# Altium footprint library 3.22-杂项.PcbLib: 985 footprints (part 13 of 64)
Each footprint in its own frame and in the unit in brackets; x right, y up, seen from the top. Pads: shape width x height; smd on the part's side, far side on the other; paste and mask are expansions set on the pad; w line width, h text height; cw(c..) or ccw(c..) is an arc to the next point about the centre after c.
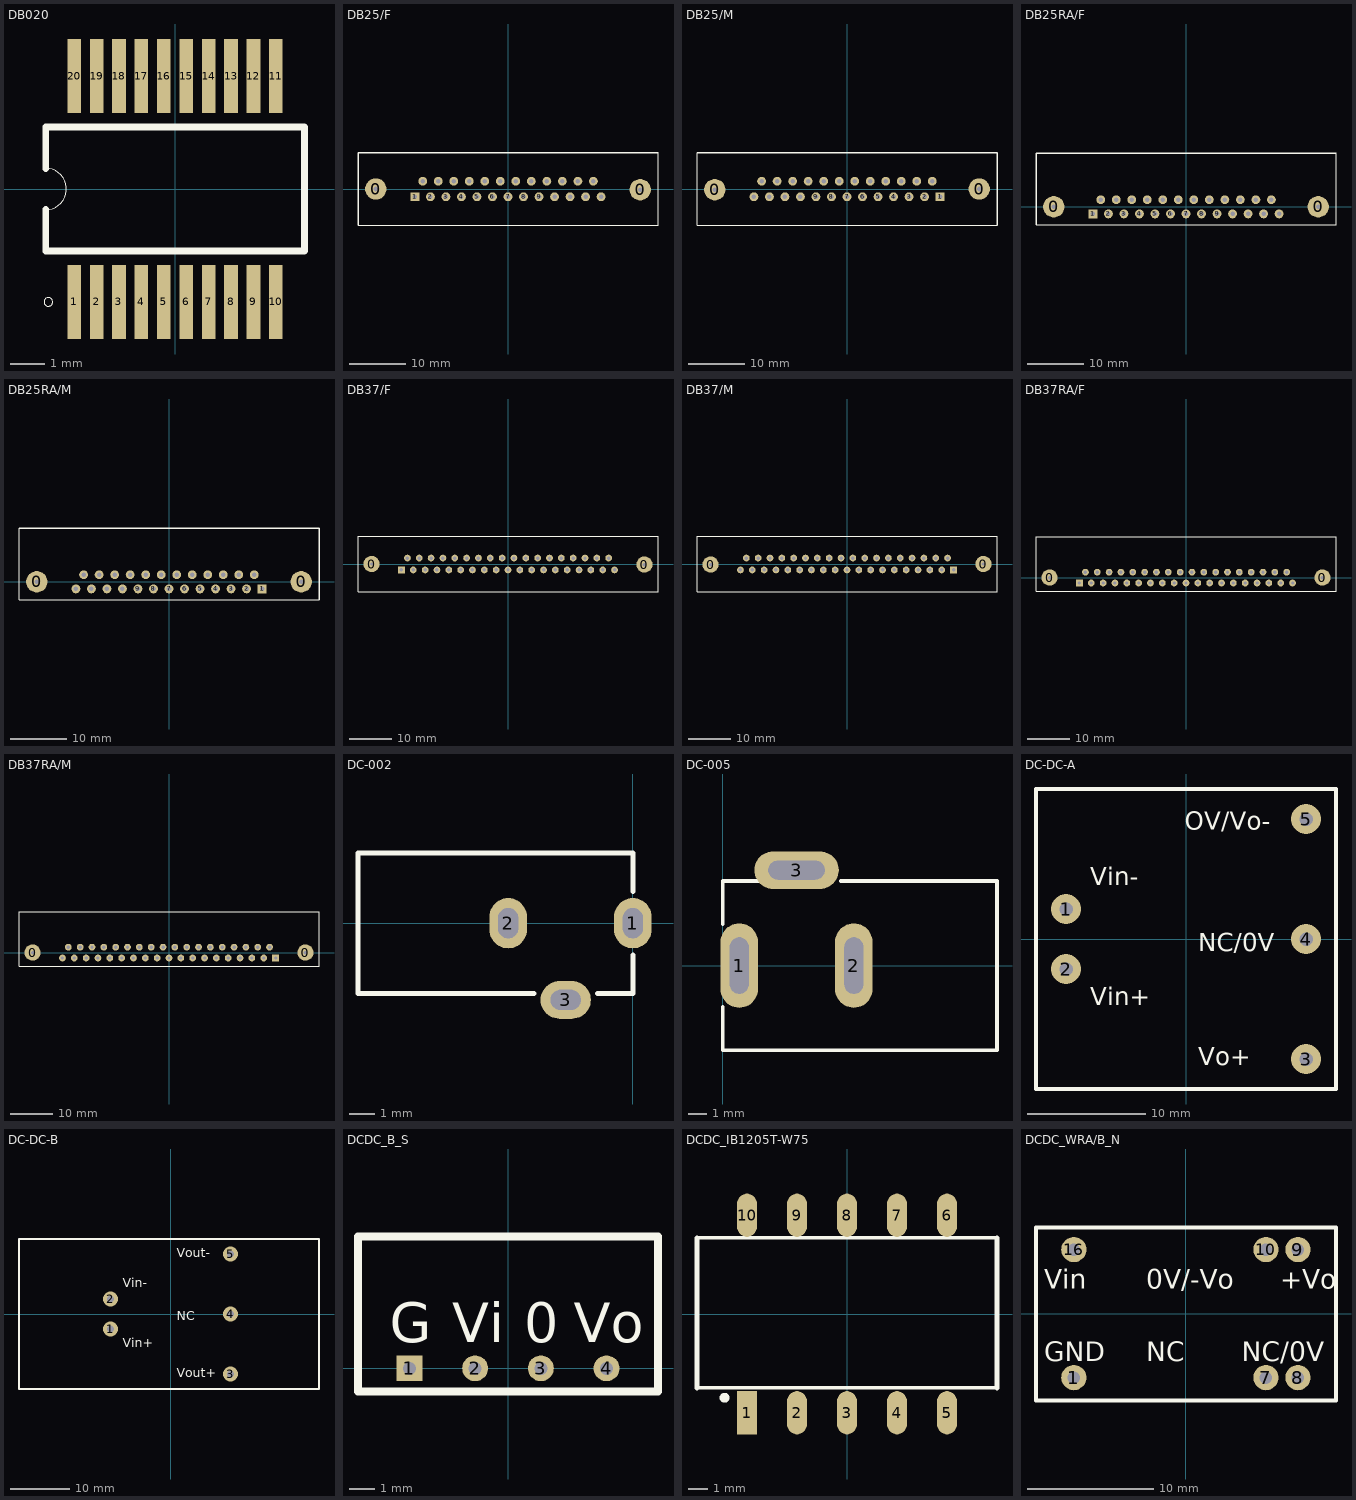
[diagram p12: the footprints below, top view; thin cyan lines are the x and y axes]

## DB020 [mm] "Plastic SSOP; 20 Leads; Body Width 5.3 mm; Pitch 0.65 mm"
height 2
pads (20):
  rect 0.396x2.15 smd: 1(-2.925,-3.275) 2(-2.275,-3.275) 3(-1.625,-3.275) 4(-0.975,-3.275) 5(-0.325,-3.275) 6(0.325,-3.275) 7(0.975,-3.275) 8(1.625,-3.275) 9(2.275,-3.275) 10(2.925,-3.275) 11(2.925,3.275) 12(2.275,3.275) 13(1.625,3.275) 14(0.975,3.275) 15(0.325,3.275) 16(-0.325,3.275) 17(-0.975,3.275) 18(-1.625,3.275) 19(-2.275,3.275) 20(-2.925,3.275)
Top Overlay:
  circle w0.025: c-3.675,-3.275 r0.125
  lines w0.025: -3.75,-0.6 ccw(c-3.75,0) -3.75,0.6
  lines w0.2: -3.75,-0.6 -3.75,-1.8 3.75,-1.8 3.75,1.8 -3.75,1.8 -3.75,0.6

## DB25/F [mil]
pads (27):
  round 150 hole 32: 0(-929,0) 0(929,-5)
  rect 62x62 hole 32: 1(-654,-55)
  round 62 hole 32: 2(-545,-55) 3(-436,-55) 4(-327,-55) 5(-218,-55) 6(-109,-55) 7(0,-55) 8(109,-55) 9(218,-55) 10(327,-55) 11(436,-55) 12(545,-55) 13(654,-55) 14(-599,55) 15(-490,55) 16(-381,55) 17(-272,55) 18(-163,55) 19(-54,55) 20(55,55) 21(164,55) 22(273,55) 23(382,55) 24(491,55) 25(600,55)
Top Overlay:
  lines w8: -1054,-255 1054,-255 1054,255
  lines w10: -1054,-255 -1054,255 1054,255

## DB25/M [mil]
pads (27):
  round 150 hole 32: 0(-929,-5) 0(929,0)
  rect 62x62 hole 32: 1(654,-55)
  round 62 hole 32: 2(545,-55) 3(436,-55) 4(327,-55) 5(218,-55) 6(109,-55) 7(0,-55) 8(-109,-55) 9(-218,-55) 10(-327,-55) 11(-436,-55) 12(-545,-55) 13(-654,-55) 14(599,55) 15(490,55) 16(381,55) 17(272,55) 18(163,55) 19(54,55) 20(-55,55) 21(-164,55) 22(-273,55) 23(-382,55) 24(-491,55) 25(-600,55)
Top Overlay:
  lines w8: -1054,255 -1054,-255 1054,-255
  lines w10: -1054,255 1054,255 1054,-255

## DB25RA/F [mil]
pads (27):
  round 150 hole 32: 0(-929,0) 0(929,0)
  rect 62x62 hole 32: 1(-654,-50)
  round 62 hole 32: 2(-545,-50) 3(-436,-50) 4(-327,-50) 5(-218,-50) 6(-109,-50) 7(0,-50) 8(109,-50) 9(218,-50) 10(327,-50) 11(436,-50) 12(545,-50) 13(654,-50) 14(-599,50) 15(-490,50) 16(-381,50) 17(-272,50) 18(-163,50) 19(-54,50) 20(55,50) 21(164,50) 22(273,50) 23(382,50) 24(491,50) 25(600,50)
Top Overlay:
  lines w8: -1054,-125 1054,-125 1054,375
  lines w10: -1054,-125 -1054,375 1054,375

## DB25RA/M [mil]
pads (27):
  round 150 hole 32: 0(-929,0) 0(929,0)
  rect 62x62 hole 32: 1(654,-50)
  round 62 hole 32: 2(545,-50) 3(436,-50) 4(327,-50) 5(218,-50) 6(109,-50) 7(0,-50) 8(-109,-50) 9(-218,-50) 10(-327,-50) 11(-436,-50) 12(-545,-50) 13(-654,-50) 14(599,50) 15(490,50) 16(381,50) 17(272,50) 18(163,50) 19(54,50) 20(-55,50) 21(-164,50) 22(-273,50) 23(-382,50) 24(-491,50) 25(-600,50)
Top Overlay:
  lines w8: -1054,375 -1054,-125 1054,-125
  lines w10: -1054,375 1054,375 1054,-125

## DB37/F [mil]
pads (39):
  round 150 hole 32: 0(-1256,0) 0(1256,-5)
  rect 62x62 hole 32: 1(-981,-55)
  round 62 hole 32: 2(-872,-55) 3(-763,-55) 4(-654,-55) 5(-545,-55) 6(-436,-55) 7(-327,-55) 8(-218,-55) 9(-109,-55) 10(0,-55) 11(109,-55) 12(218,-55) 13(327,-55) 14(436,-55) 15(545,-55) 16(654,-55) 17(763,-55) 18(872,-55) 19(981,-55) 20(-926,55) 21(-817,55) 22(-708,55) 23(-599,55) 24(-490,55) 25(-381,55) 26(-272,55) 27(-163,55) 28(-54,55) 29(55,55) 30(164,55) 31(273,55) 32(382,55) 33(491,55) 34(600,55) 35(709,55) 36(818,55) 37(927,55)
Top Overlay:
  lines w8: -1381,-255 1381,-255 1381,255
  lines w10: -1381,-255 -1381,255 1381,255

## DB37/M [mil]
pads (39):
  round 150 hole 32: 0(-1256,-5) 0(1256,0)
  rect 62x62 hole 32: 1(981,-55)
  round 62 hole 32: 2(872,-55) 3(763,-55) 4(654,-55) 5(545,-55) 6(436,-55) 7(327,-55) 8(218,-55) 9(109,-55) 10(0,-55) 11(-109,-55) 12(-218,-55) 13(-327,-55) 14(-436,-55) 15(-545,-55) 16(-654,-55) 17(-763,-55) 18(-872,-55) 19(-981,-55) 20(926,55) 21(817,55) 22(708,55) 23(599,55) 24(490,55) 25(381,55) 26(272,55) 27(163,55) 28(54,55) 29(-55,55) 30(-164,55) 31(-273,55) 32(-382,55) 33(-491,55) 34(-600,55) 35(-709,55) 36(-818,55) 37(-927,55)
Top Overlay:
  lines w8: -1381,255 -1381,-255 1381,-255
  lines w10: -1381,255 1381,255 1381,-255

## DB37RA/F [mil]
pads (39):
  round 150 hole 32: 0(-1256,0) 0(1256,0)
  rect 62x62 hole 32: 1(-981,-50)
  round 62 hole 32: 2(-872,-50) 3(-763,-50) 4(-654,-50) 5(-545,-50) 6(-436,-50) 7(-327,-50) 8(-218,-50) 9(-109,-50) 10(0,-50) 11(109,-50) 12(218,-50) 13(327,-50) 14(436,-50) 15(545,-50) 16(654,-50) 17(763,-50) 18(872,-50) 19(981,-50) 20(-926,50) 21(-817,50) 22(-708,50) 23(-599,50) 24(-490,50) 25(-381,50) 26(-272,50) 27(-163,50) 28(-54,50) 29(55,50) 30(164,50) 31(273,50) 32(382,50) 33(491,50) 34(600,50) 35(709,50) 36(818,50) 37(927,50)
Top Overlay:
  lines w8: -1381,-125 1381,-125 1381,375
  lines w10: -1381,-125 -1381,375 1381,375

## DB37RA/M [mil]
pads (39):
  round 150 hole 32: 0(-1256,0) 0(1256,0)
  rect 62x62 hole 32: 1(981,-50)
  round 62 hole 32: 2(872,-50) 3(763,-50) 4(654,-50) 5(545,-50) 6(436,-50) 7(327,-50) 8(218,-50) 9(109,-50) 10(0,-50) 11(-109,-50) 12(-218,-50) 13(-327,-50) 14(-436,-50) 15(-545,-50) 16(-654,-50) 17(-763,-50) 18(-872,-50) 19(-981,-50) 20(926,50) 21(817,50) 22(708,50) 23(599,50) 24(490,50) 25(381,50) 26(272,50) 27(163,50) 28(54,50) 29(-55,50) 30(-164,50) 31(-273,50) 32(-382,50) 33(-491,50) 34(-600,50) 35(-709,50) 36(-818,50) 37(-927,50)
Top Overlay:
  lines w8: -1381,375 -1381,-125 1381,-125
  lines w10: -1381,375 1381,375 1381,-125

## DC-002 [mm] "DC母座3.5mm"
height 7.2
pads (3):
  oval 1.5x2 hole 0.8 slot 1.2 at 90 deg: 1(0,0) 2(-4.953,0)
  oval 2x1.5 hole 0.8 slot 1.2 at 0 deg: 3(-2.667,-3.048)
Top Overlay:
  lines w0.2: -3.937,-2.794 -10.922,-2.794 -10.922,2.794 0,2.794 0,1.27 ; -1.397,-2.794 0,-2.794 0,-1.27
3D body: height 7.2, standoff 0, extent -10.922,-2.794 0,2.794

## DC-005 [mm] "DC母座5.5mm"
height 12.75
pads (3):
  oval 2x4.5 hole 1 slot 3 at 90 deg: 1(0.889,0) 2(6.985,0)
  oval 4.5x2 hole 1 slot 3 at 0 deg: 3(3.937,5.08)
Top Overlay:
  lines w0.2: 0.005,-2.2 0.005,-4.5 14.605,-4.5 14.605,4.5 6.305,4.5 ; 0.005,2.2 0.005,4.5 1.905,4.5
3D body: height 11, standoff 0, extent 0,-4.445 14.605,4.445

## DC-DC-A [mil] "电源模块Ａ型封装，长宽均为25.4"
height 393.7
pads (5):
  round 100 hole 45: 1(-400,100) 2(-400,-100) 3(400,-400) 4(400,0) 5(400,400)
Top Overlay:
  lines w12: -500,-500 500,-500 500,500 -500,500 -500,-500
  text "NC/0V" at 40,-40 h60
  text "Vin-" at -320,180 h60
  text "Vin+" at -320,-220 h60
  text "OV/Vo-" at -5,365 h60
  text "Vo+" at 40,-420 h60

## DC-DC-B [mil] "电源模块B型，25.4宽，50.8长"
height 393.7
pads (5):
  round 100 hole 45: 1(-400,-100) 2(-400,100) 3(400,-400) 4(400,0) 5(400,400)
Top Overlay:
  lines w12.01: -1010,-500 -1010,500 990,500 990,-500 -1010,-500
  text "Vout+" at 40,-420 h60
  text "Vout-" at 40,380 h60
  text "Vin+" at -320,-220 h60
  text "Vin-" at -320,180 h60
  text "NC" at 40,-40 h60

## DCDC_B_S [mm] "MORNSON B1205S-1W定电压1000VDC隔离非稳压单输出，SIIP/DIP封装"
height 10
pads (4):
  rect 1x1 hole 0.5: 1(-3.81,0)
  round 1 hole 0.5: 2(-1.27,0) 3(1.27,0) 4(3.81,0)
Top Overlay:
  lines w0.305: -5.8,-0.9 -5.8,5.1 5.8,5.1 5.8,-0.9 -5.8,-0.9
  text "Vo" at 2.54,1.016 h1.52
  text "0" at 0.635,1.016 h1.52
  text "G" at -4.572,1.016 h1.52
  text "Vi" at -2.159,1.016 h1.52

## DCDC_IB1205T-W75 [mm] "定电压1000VDC隔离0.75W"
pads (10):
  rect 1x2.2 smd: 1(-5.08,-5.016)
  oval 1x2.2 smd: 2(-2.54,-5.016) 3(0,-5.016) 4(2.54,-5.016) 5(5.08,-5.016) 6(5.08,5.016) 7(2.54,5.016) 8(0,5.016) 9(-2.54,5.016) 10(-5.08,5.016)
Top Overlay:
  circle w0.25: c-6.221,-4.255 r0.125
  lines w0.2: -7.62,-3.746 7.62,-3.746 ; -7.62,3.873 7.62,3.873
  lines w0.254: -7.62,-3.746 -7.62,3.873 ; 7.62,-3.746 7.62,3.873

## DCDC_WRA/B_N [mm] "MORNSON WRA 双路或WRB单路2：1（1~3W）直插小型封装1~3W"
height 10
pads (6):
  round 2 hole 1: 1(-8.89,-5.08) 7(6.35,-5.08) 8(8.89,-5.08) 9(8.89,5.08) 10(6.35,5.08) 16(-8.89,5.08)
Top Overlay:
  lines w0.305: -11.89,-6.88 -11.89,6.82 11.91,6.82 11.91,-6.88 -11.89,-6.88
  text "GND" at -11.227,-3.785 h1.52
  text "Vin" at -11.227,1.981 h1.52
  text "0V/-Vo" at -3.15,1.981 h1.52
  text "+Vo" at 7.468,1.981 h1.52
  text "NC/0V" at 4.421,-3.785 h1.52
  text "NC" at -3.15,-3.785 h1.52